# Altium footprint library 左手键盘1.PcbLib: 20 footprints (part 2 of 2)
Each footprint in its own frame and in the unit in brackets; x right, y up, seen from the top. Pads: shape width x height; smd on the part's side, far side on the other; paste and mask are expansions set on the pad; w line width, h text height; cw(c..) or ccw(c..) is an arc to the next point about the centre after c.
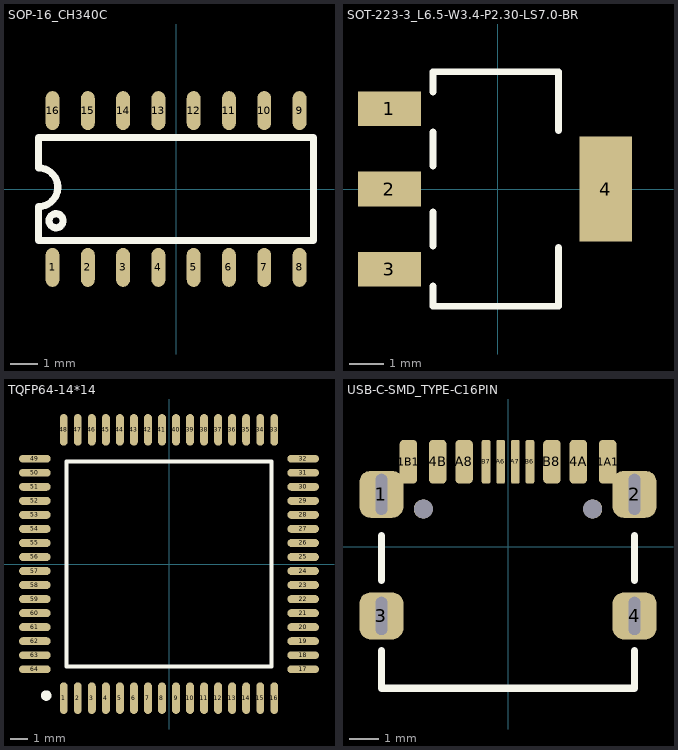
[diagram p1: the footprints below, top view; thin cyan lines are the x and y axes]

## SOP-16_CH340C [mm]
pads (16):
  oval 0.5x1.4 smd: 1(-4.445,-2.822) 2(-3.175,-2.822) 3(-1.905,-2.822) 4(-0.635,-2.822) 5(0.635,-2.822) 6(1.905,-2.822) 7(3.175,-2.822) 8(4.445,-2.822) 9(4.445,2.822) 10(3.175,2.822) 11(1.905,2.822) 12(0.635,2.822) 13(-0.635,2.822) 14(-1.905,2.822) 15(-3.175,2.822) 16(-4.445,2.822)
Top Overlay:
  circle w0.254: c-4.318,-1.143 r0.254
  lines w0.254: -4.953,0.762 cw(c-4.953,0.064) -4.953,-0.635 -4.953,-1.85 -4.95,-1.85 4.95,-1.85 4.95,1.85 -4.95,1.85 -4.95,0.762
3D body "SOP16.STEP": height 1.9, standoff 0, extent -5,-3.003 5,3.003

## SOT-223-3_L6.5-W3.4-P2.30-LS7.0-BR [mm]
pads (4):
  rect 1.8x1 smd: 1(-3.099,2.3) 2(-3.099,0) 3(-3.099,-2.3)
  rect 1.5x3 smd: 4(3.099,0)
Top Overlay:
  lines w0.2: -1.85,-2.775 -1.85,-3.36 1.75,-3.36 1.75,-1.675 ; -1.85,-1.635 -1.85,-0.665 ; -1.85,0.665 -1.85,1.635 ; -1.85,2.775 -1.85,3.36 1.75,3.36 1.75,1.675
3D body "SOT223.STEP": height 1.65, standoff -0.02, extent -3.508,-3.25 3.508,3.25

## TQFP64-14*14 [mm] "14x14mm, 0.8mm(蒜米工坊）"
pads (64):
  oval 0.45x1.8 smd: 1(-6,-7.651) 2(-5.2,-7.651) 3(-4.4,-7.651) 4(-3.6,-7.651) 5(-2.8,-7.651) 6(-2,-7.651) 7(-1.2,-7.651) 8(-0.4,-7.651) 9(0.4,-7.651) 10(1.2,-7.651) 11(2,-7.651) 12(2.8,-7.651) 13(3.6,-7.651) 14(4.4,-7.651) 15(5.2,-7.651) 16(6,-7.651) 33(6,7.651) 34(5.2,7.651) 35(4.4,7.651) 36(3.6,7.651) 37(2.8,7.651) 38(2,7.651) 39(1.2,7.651) 40(0.4,7.651) 41(-0.4,7.651) 42(-1.2,7.651) 43(-2,7.651) 44(-2.8,7.651) 45(-3.6,7.651) 46(-4.4,7.651) 47(-5.2,7.651) 48(-6,7.651)
  oval 1.8x0.45 smd: 17(7.651,-6) 18(7.651,-5.2) 19(7.651,-4.4) 20(7.651,-3.6) 21(7.651,-2.8) 22(7.651,-2) 23(7.651,-1.2) 24(7.651,-0.4) 25(7.651,0.4) 26(7.651,1.2) 27(7.651,2) 28(7.651,2.8) 29(7.651,3.6) 30(7.651,4.4) 31(7.651,5.2) 32(7.651,6) 49(-7.651,6) 50(-7.651,5.2) 51(-7.651,4.4) 52(-7.651,3.6) 53(-7.651,2.8) 54(-7.651,2) 55(-7.651,1.2) 56(-7.651,0.4) 57(-7.651,-0.4) 58(-7.651,-1.2) 59(-7.651,-2) 60(-7.651,-2.8) 61(-7.651,-3.6) 62(-7.651,-4.4) 63(-7.651,-5.2) 64(-7.651,-6)
Top Overlay:
  circle w0.35: c-7,-7.5 r0.125
  lines w0.254: -5.842,-5.842 -5.842,5.842 5.842,5.842 5.842,-5.842 -5.842,-5.842
3D body "TQFP64_14x14.STEP": height 1.05, standoff 0, extent -8.002,-8.002 8.002,8.002

## USB-C-SMD_TYPE-C16PIN [mm]
pads (16):
  rrect50% 1.5x1.6 hole 0.4 slot 1.4 at 90 deg: 1(-4.32,1.787) 2(4.32,1.787)
  rrect50% 1.5x1.6 hole 0.4 slot 1.3 at 90 deg: 3(-4.32,-2.362) 4(4.32,-2.362)
  rrect50% 0.6x1.5 smd: A1B12(-3.4,2.9) A4B9(-2.4,2.9) A8(-1.5,2.9) B1A12(3.4,2.9) B4A9(2.4,2.9) B8(1.5,2.9)
  rrect50% 0.3x1.5 smd: A6(-0.25,2.9) A7(0.25,2.9) B6(0.75,2.9) B7(-0.75,2.9)
  round 0.65 hole 0.65 unplated: ""(-2.89,1.288) ""(2.89,1.288)
Top Overlay:
  lines w0.254: -4.318,-3.556 -4.318,-4.83 4.318,-4.83 4.318,-3.556 ; -4.318,-1.143 -4.318,0.381 ; 4.318,-1.143 4.318,0.381
3D body "USB Type-C_A.STEP": height 3.25, standoff -0.85, extent -4.47,-4.95 4.47,2.95